# Altium footprint library Selex_PCBLib.PcbLib: 388 footprints (part 12 of 25)
Each footprint in its own frame and in the unit in brackets; x right, y up, seen from the top. Pads: shape width x height; smd on the part's side, far side on the other; paste and mask are expansions set on the pad; w line width, h text height; cw(c..) or ccw(c..) is an arc to the next point about the centre after c.
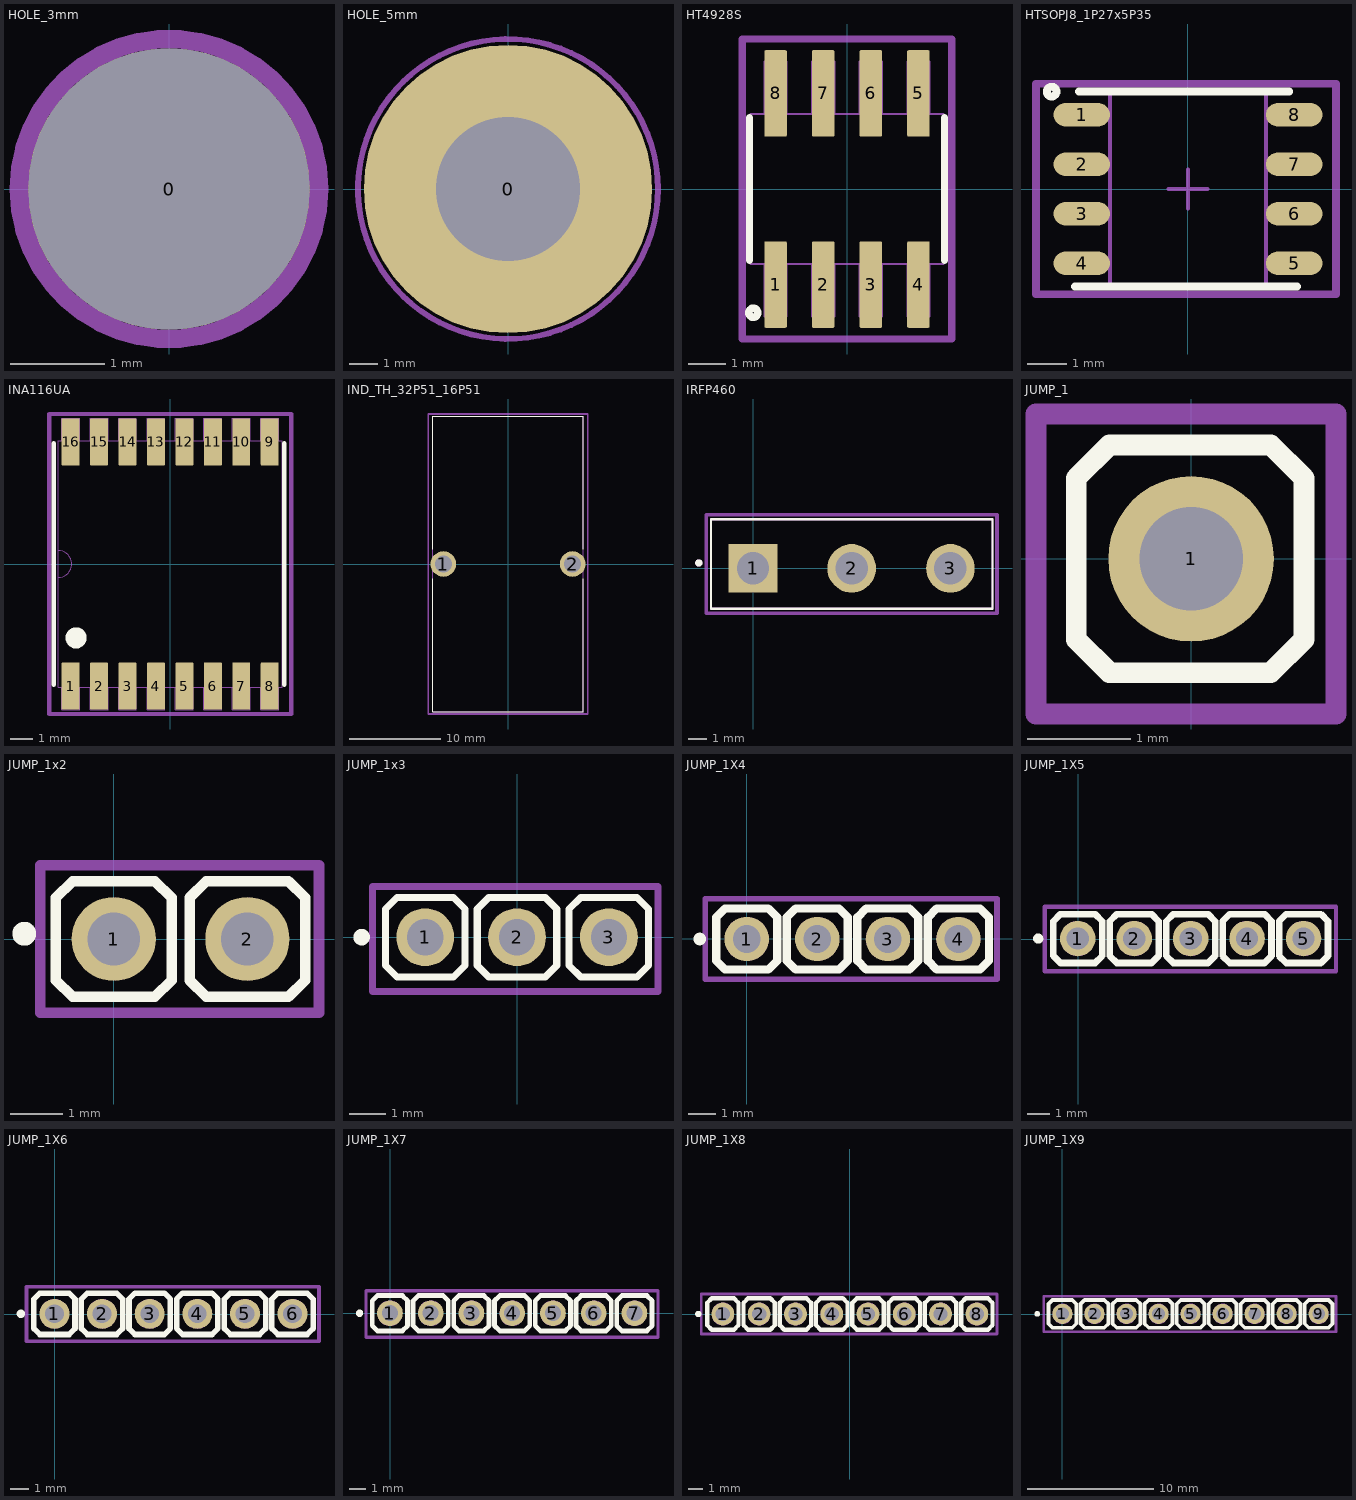
[diagram p11: the footprints below, top view; thin cyan lines are the x and y axes]

## HOLE_3mm [mm]
pads (1):
  round 3 hole 3 mask+0.075: 0(0,0)
Mechanical 15:
  circle w0.2: c0,0 r1.6

## HOLE_5mm [mm]
pads (1):
  round 10 hole 5 mask+0.075: 0(0,0)
Mechanical 15:
  circle w0.2: c0,0 r5.2

## HT4928S [mm] "SOP8, SMD, 1.27MM"
pads (8):
  rrect10% 0.6x2.3 smd mask+0.05: 1(-1.905,-2.55) 2(-0.635,-2.55) 3(0.635,-2.55) 4(1.905,-2.55) 5(1.905,2.55) 6(0.635,2.55) 7(-0.635,2.55) 8(-1.905,2.55)
Top Overlay:
  circle w0.2: c-2.5,-3.3 r0.12
  lines w0.2: -2.6,-1.9 -2.6,1.9 ; 2.6,-1.9 2.6,1.9
Mechanical 1:
  lines w0.05: -2.575,-0.5 -2.575,-2 2.575,-2 2.575,2 -2.575,2 -2.575,0.5 ; -2.205,-3.4 -1.605,-3.4 -1.605,-2 -2.205,-2 -2.205,-3.4 ; -2.205,2 -1.605,2 -1.605,3.4 -2.205,3.4 -2.205,2 ; -0.935,-3.4 -0.935,-2 -0.335,-2 -0.335,-3.4 -0.935,-3.4 ; -0.935,2 -0.335,2 -0.335,3.4 -0.935,3.4 -0.935,2 ; 0.335,-3.4 0.335,-2 0.935,-2 0.935,-3.4 0.335,-3.4 ; 0.335,2 0.935,2 0.935,3.4 0.335,3.4 0.335,2 ; 1.605,-3.4 1.605,-2 2.205,-2 2.205,-3.4 1.605,-3.4 ; 1.605,2 1.605,3.4 2.205,3.4 2.205,2 1.605,2
  text "1" at -2,-1.8 h0.6
  text "4" at 1.7,-1.7 h0.6
  text "5" at 1.7,1.1 h0.6
  text "8" at -2.1,1.1 h0.6
Mechanical 7:
  lines w0.2: -2.8,-4 -2.8,-0.8 -2.8,4 2.8,4 2.8,-4 -2.8,-4
3D body "User Library-HSOP8.STEP": height 1.75, standoff 0, extent -2.5,-3.1 2.5,3.1

## HTSOPJ8_1P27x5P35 [mm] "TSOP, 8-Leads, Body 4.90x3.90mm, Pitch 1.27mm, IPC Medium Density"
height 1
pads (8):
  oval 1.45x0.6 smd: 1(-2.725,1.905) 2(-2.725,0.635) 3(-2.725,-0.635) 4(-2.725,-1.905) 5(2.725,-1.905) 6(2.725,-0.635) 7(2.725,0.635) 8(2.725,1.905)
Top Overlay:
  circle w0.2: c-3.5,2.5 r0.125
  lines w0.2: -2.9,-2.5 2.8,-2.5 ; -2.8,2.5 2.6,2.5
Mechanical 13:
  lines w0.1: -2,-2.5 -2,2.5 2,2.5 2,-2.5 -2,-2.5
Mechanical 15:
  lines w0.1: -0.5,0 0.5,0 ; 0,-0.5 0,0.5
  lines w0.2: -3.9,-2.7 -3.9,2.7 3.8,2.7 3.8,-2.7 -3.9,-2.7
3D body "HTSOP-J8.STEP": height 1.08, standoff 0, extent -3.012,-2.45 3.012,2.45

## INA116UA [mm] "SMD, SOL 16"
pads (16):
  rrect10% 0.8x2.1 smd mask+0.05: 1(-4.445,-5.45) 2(-3.175,-5.45) 3(-1.905,-5.45) 4(-0.635,-5.45) 5(0.635,-5.45) 6(1.905,-5.45) 7(3.175,-5.45) 8(4.445,-5.45) 9(4.445,5.45) 10(3.175,5.45) 11(1.905,5.45) 12(0.635,5.45) 13(-0.635,5.45) 14(-1.905,5.45) 15(-3.175,5.45) 16(-4.445,5.45)
Top Overlay:
  circle w0.5: c-4.2,-3.3 r0.224
  lines w0.2: -5.2,-5.4 -5.2,5.4 ; 5.1,-5.4 5.1,5.4
Mechanical 1:
  lines w0.05: -5,-0.6 ccw(c-5,0) -5,0.6 ; -5,-5.5 -5,5.5 5,5.5 5,-5.5 -5,-5.5 ; -4.845,-6.5 -4.845,-5.5 -4.045,-5.5 -4.045,-6.5 -4.845,-6.5 ; -4.845,5.5 -4.845,6.5 -4.045,6.5 -4.045,5.5 -4.845,5.5 ; -3.575,-6.5 -2.775,-6.5 -2.775,-5.5 -3.575,-5.5 -3.575,-6.5 ; -3.575,5.5 -3.575,6.5 -2.775,6.5 -2.775,5.5 -3.575,5.5 ; -2.305,-6.5 -1.505,-6.5 -1.505,-5.5 -2.305,-5.5 -2.305,-6.5 ; -2.305,5.5 -2.305,6.5 -1.505,6.5 -1.505,5.5 -2.305,5.5 ; -1.035,-6.5 -0.235,-6.5 -0.235,-5.5 -1.035,-5.5 -1.035,-6.5 ; -1.035,5.5 -1.035,6.5 -0.235,6.5 -0.235,5.5 -1.035,5.5 ; 0.235,-6.5 1.035,-6.5 1.035,-5.5 0.235,-5.5 0.235,-6.5 ; 0.235,5.5 0.235,6.5 1.035,6.5 1.035,5.5 0.235,5.5 ; 1.505,-6.5 2.305,-6.5 2.305,-5.5 1.505,-5.5 1.505,-6.5 ; 1.505,5.5 1.505,6.5 2.305,6.5 2.305,5.5 1.505,5.5 ; 2.775,-6.5 3.575,-6.5 3.575,-5.5 2.775,-5.5 2.775,-6.5 ; 2.775,5.5 2.775,6.5 3.575,6.5 3.575,5.5 2.775,5.5 ; 4.045,-6.5 4.845,-6.5 4.845,-5.5 4.045,-5.5 4.045,-6.5 ; 4.045,5.5 4.045,6.5 4.845,6.5 4.845,5.5 4.045,5.5
Mechanical 7:
  lines w0.2: -5.4,-6.7 5.4,-6.7 5.4,6.7 -5.4,6.7 -5.4,-2.2 -5.4,-6.7
3D body "DW16-L.step": height 2.64, standoff 0, extent -5.245,-5.221 5.245,5.421

## IND_TH_32P51_16P51 [mm]
pads (2):
  round 2.82 hole 1.88: 1(-7.112,0) 2(7.112,0)
Top Overlay:
  lines w0.127: -8.255,-1.6 -8.255,-16.256 8.255,-16.256 8.255,-1.6 ; -8.255,1.6 -8.255,16.256 8.255,16.256 8.255,1.6
Mechanical 13:
  lines w0.127: -8.255,-16.256 -8.255,16.256 8.255,16.256 8.255,-16.256 -8.255,-16.256
Mechanical 15:
  lines w0.2: -8.78,-16.506 -8.78,16.506 8.78,16.506 8.78,-16.506 -8.78,-16.506

## IRFP460 [mm]
pads (3):
  rect 2.69x2.69 hole 1.79: 1(0,0)
  round 2.69 hole 1.79: 2(5.46,0) 3(10.92,0)
Top Overlay:
  circle w0.2: c-3,0.3 r0.1
  lines w0.127: -2.33,-2.235 -2.33,2.71 13.25,2.71 13.25,-2.235 -2.33,-2.235
Mechanical 13:
  circle w0.2: c-3,0.3 r0.1
  lines w0.127: -2.33,-2.235 -2.33,2.71 13.25,2.71 13.25,-2.235 -2.33,-2.235
Mechanical 15:
  lines w0.2: -2.58,-2.485 -2.58,2.965 13.5,2.965 13.5,-2.485 -2.58,-2.485
3D body "IRFP460--3DModel-STEP-56544.STEP": height 30.1, standoff -5, extent -2.34,-2.3 13.26,2.7

## JUMP_1 [mm] "JUMP_1_2P54"
pads (1):
  round 1.6 hole 1 mask+0.1: 1(0,0)
Top Overlay:
  lines w0.2: -1.11,-0.78 -0.79,-1.1 0.77,-1.1 1.09,-0.78 1.09,0.78 0.77,1.1 -0.79,1.1 -1.11,0.78 -1.11,-0.78
Mechanical 1:
  circle w0.05: c0,0 r0.762
  lines w0.05: -1.1,-0.78 -0.78,-1.1 0.78,-1.1 1.1,-0.78 1.1,0.78 0.78,1.1 -0.78,1.1 -1.1,0.78 -1.1,-0.78
  text "1" at -0.1,-0.4 h0.8
Mechanical 15:
  lines w0.2: -1.5,-1.5 -1.5,1.4 1.4,1.4 1.4,-1.5 -1.5,-1.5
3D body "HEADER1.step": height 5.94, standoff -2.94, extent -1.3,-1.3 1.24,1.24

## JUMP_1x2 [mm] "JUMP_1x2_2P54"
pads (2):
  round 1.6 hole 1 mask+0.1: 1(0,0) 2(2.54,0)
Top Overlay:
  circle w0.254: c-1.7,0.1 r0.1
  lines w0.2: -1.1,-0.78 -1.1,0.78 -0.78,1.1 0.78,1.1 1.1,0.78 1.1,-0.78 0.78,-1.1 -0.78,-1.1 -1.1,-0.78 ; 1.44,-0.78 1.44,0.78 1.76,1.1 3.32,1.1 3.64,0.78 3.64,-0.78 3.32,-1.1 1.76,-1.1 1.44,-0.78
Mechanical 1:
  circle w0.05: c0,0 r0.762
  circle w0.05: c2.54,0 r0.762
  lines w0.05: -1.1,-0.78 -0.78,-1.1 0.78,-1.1 1.1,-0.78 1.1,0.78 0.78,1.1 -0.78,1.1 -1.1,0.78 -1.1,-0.78 ; 1.44,-0.78 1.44,0.78 1.76,1.1 3.32,1.1 3.64,0.78 3.64,-0.78 3.32,-1.1 1.76,-1.1 1.44,-0.78
  text "1" at -0.1,-0.4 h0.8
  text "2" at 2.3,-0.4 h0.8
Mechanical 15:
  lines w0.2: -1.4,-1.4 -1.4,1.4 3.9,1.4 3.9,-1.4 -1.4,-1.4
3D body "HEADER1.step": height 5.94, standoff -2.94, extent -1.3,-1.3 1.24,1.24
3D body "HEADER1.step": height 5.94, standoff -2.94, extent 1.24,-1.3 3.78,1.24

## JUMP_1x3 [mm] "JUMP_1x3_2P54"
pads (3):
  round 1.6 hole 1 mask+0.1: 1(-2.54,0) 2(0,0) 3(2.54,0)
Top Overlay:
  circle w0.254: c-4.3,0 r0.1
  lines w0.2: -3.64,-0.78 -3.32,-1.1 -1.76,-1.1 -1.44,-0.78 -1.44,0.78 -1.76,1.1 -3.32,1.1 -3.64,0.78 -3.64,-0.78 ; -1.1,-0.78 -0.78,-1.1 0.78,-1.1 1.1,-0.78 1.1,0.78 0.78,1.1 -0.78,1.1 -1.1,0.78 -1.1,-0.78 ; 1.44,-0.78 1.76,-1.1 3.32,-1.1 3.64,-0.78 3.64,0.78 3.32,1.1 1.76,1.1 1.44,0.78 1.44,-0.78
Mechanical 1:
  circle w0.05: c2.54,0 r0.762
  circle w0.05: c0,0 r0.762
  circle w0.05: c-2.54,0 r0.762
  lines w0.05: -3.64,-0.78 -3.64,0.78 -3.32,1.1 -1.76,1.1 -1.44,0.78 -1.44,-0.78 -1.76,-1.1 -3.32,-1.1 -3.64,-0.78 ; -1.1,-0.78 -1.1,0.78 -0.78,1.1 0.78,1.1 1.1,0.78 1.1,-0.78 0.78,-1.1 -0.78,-1.1 -1.1,-0.78 ; 1.44,-0.78 1.44,0.78 1.76,1.1 3.32,1.1 3.64,0.78 3.64,-0.78 3.32,-1.1 1.76,-1.1 1.44,-0.78
  text "1" at -2.64,-0.4 h0.8
  text "2" at -0.24,-0.4 h0.8
  text "3" at 2.26,-0.4 h0.8
Mechanical 15:
  lines w0.2: -4,-1.5 -4,1.4 3.9,1.4 3.9,-1.5 -4,-1.5
3D body "HEADER1.step": height 5.94, standoff -2.94, extent 1.24,-1.3 3.78,1.24
3D body "HEADER1.step": height 5.94, standoff -2.94, extent -1.3,-1.3 1.24,1.24
3D body "HEADER1.step": height 5.94, standoff -2.94, extent -3.84,-1.3 -1.3,1.24

## JUMP_1X4 [mm] "JUMP_1X4_2P54"
pads (4):
  round 1.6 hole 1 mask+0.1: 1(-0.01,-0.01) 2(2.53,-0.01) 3(5.07,-0.01) 4(7.61,-0.01)
Top Overlay:
  circle w0.254: c-1.7,-0.01 r0.1
  lines w0.3: -1.11,-0.79 -1.11,0.77 -0.79,1.09 0.77,1.09 1.09,0.77 1.09,-0.79 0.77,-1.11 -0.79,-1.11 -1.11,-0.79 ; 1.43,-0.79 1.43,0.77 1.75,1.09 3.31,1.09 3.63,0.77 3.63,-0.79 3.31,-1.11 1.75,-1.11 1.43,-0.79 ; 3.97,-0.79 3.97,0.77 4.29,1.09 5.85,1.09 6.17,0.77 6.17,-0.79 5.85,-1.11 4.29,-1.11 3.97,-0.79 ; 6.51,-0.79 6.51,0.77 6.83,1.09 8.39,1.09 8.71,0.77 8.71,-0.79 8.39,-1.11 6.83,-1.11 6.51,-0.79
Mechanical 1:
  circle w0.05: c-0.01,-0.01 r0.762
  circle w0.05: c2.53,-0.01 r0.762
  circle w0.05: c5.07,-0.01 r0.762
  circle w0.05: c7.61,-0.01 r0.762
  lines w0.05: -1.11,-0.79 -0.79,-1.11 0.77,-1.11 1.09,-0.79 1.09,0.77 0.77,1.09 -0.79,1.09 -1.11,0.77 -1.11,-0.79 ; 1.43,-0.79 1.75,-1.11 3.31,-1.11 3.63,-0.79 3.63,0.77 3.31,1.09 1.75,1.09 1.43,0.77 1.43,-0.79 ; 3.97,-0.79 4.29,-1.11 5.85,-1.11 6.17,-0.79 6.17,0.77 5.85,1.09 4.29,1.09 3.97,0.77 3.97,-0.79 ; 6.51,-0.79 6.83,-1.11 8.39,-1.11 8.71,-0.79 8.71,0.77 8.39,1.09 6.83,1.09 6.51,0.77 6.51,-0.79
  text "1" at -0.18,-0.37 h0.8
  text "2" at 2.22,-0.37 h0.8
  text "3" at 4.82,-0.37 h0.8
  text "4" at 7.32,-0.37 h0.8
Mechanical 15:
  lines w0.2: -1.5,-1.46 -1.5,1.44 9,1.44 9,-1.46 -1.5,-1.46
3D body "HEADER1.step": height 5.94, standoff -2.94, extent 3.77,-1.31 6.31,1.23
3D body "HEADER1.step": height 5.94, standoff -2.94, extent 6.31,-1.31 8.85,1.23
3D body "HEADER1.step": height 5.94, standoff -2.94, extent 1.23,-1.31 3.77,1.23
3D body "HEADER1.step": height 5.94, standoff -2.94, extent -1.31,-1.31 1.23,1.23

## JUMP_1X5 [mm] "JUMP_1X5_2P54"
pads (5):
  round 1.6 hole 1 mask+0.1: 1(-0.02,0.02) 2(2.52,0.02) 3(5.06,0.02) 4(7.6,0.02) 5(10.14,0.02)
Top Overlay:
  circle w0.254: c-1.8,0.02 r0.1
  lines w0.3: -1.12,-0.76 -0.8,-1.08 0.76,-1.08 1.08,-0.76 1.08,0.8 0.76,1.12 -0.8,1.12 -1.12,0.8 -1.12,-0.76 ; 1.42,-0.76 1.74,-1.08 3.3,-1.08 3.62,-0.76 3.62,0.8 3.3,1.12 1.74,1.12 1.42,0.8 1.42,-0.76 ; 3.96,-0.76 4.28,-1.08 5.84,-1.08 6.16,-0.76 6.16,0.8 5.84,1.12 4.28,1.12 3.96,0.8 3.96,-0.76 ; 6.5,-0.76 6.82,-1.08 8.38,-1.08 8.7,-0.76 8.7,0.8 8.38,1.12 6.82,1.12 6.5,0.8 6.5,-0.76 ; 9.04,-0.76 9.36,-1.08 10.92,-1.08 11.24,-0.76 11.24,0.8 10.92,1.12 9.36,1.12 9.04,0.8 9.04,-0.76
Mechanical 1:
  circle w0.05: c10.14,0.02 r0.762
  circle w0.05: c7.6,0.02 r0.762
  circle w0.05: c5.06,0.02 r0.762
  circle w0.05: c2.52,0.02 r0.762
  circle w0.05: c-0.02,0.02 r0.762
  lines w0.05: -1.12,-0.76 -1.12,0.8 -0.8,1.12 0.76,1.12 1.08,0.8 1.08,-0.76 0.76,-1.08 -0.8,-1.08 -1.12,-0.76 ; 1.42,-0.76 1.42,0.8 1.74,1.12 3.3,1.12 3.62,0.8 3.62,-0.76 3.3,-1.08 1.74,-1.08 1.42,-0.76 ; 3.96,-0.76 3.96,0.8 4.28,1.12 5.84,1.12 6.16,0.8 6.16,-0.76 5.84,-1.08 4.28,-1.08 3.96,-0.76 ; 6.5,-0.76 6.5,0.8 6.82,1.12 8.38,1.12 8.7,0.8 8.7,-0.76 8.38,-1.08 6.82,-1.08 6.5,-0.76 ; 9.04,-0.76 9.04,0.8 9.36,1.12 10.92,1.12 11.24,0.8 11.24,-0.76 10.92,-1.08 9.36,-1.08 9.04,-0.76
  text "5" at 9.88,-0.38 h0.8
  text "1" at -0.12,-0.38 h0.8
  text "2" at 2.28,-0.38 h0.8
  text "3" at 4.86,-0.38 h0.8
  text "4" at 7.26,-0.38 h0.8
Mechanical 15:
  lines w0.2: -1.5,-1.45 -1.5,1.45 11.6,1.45 11.6,-1.45 -1.5,-1.45
3D body "HEADER1.step": height 5.94, standoff -2.94, extent 8.84,-1.28 11.38,1.26
3D body "HEADER1.step": height 5.94, standoff -2.94, extent 6.3,-1.28 8.84,1.26
3D body "HEADER1.step": height 5.94, standoff -2.94, extent 3.76,-1.28 6.3,1.26
3D body "HEADER1.step": height 5.94, standoff -2.94, extent 1.22,-1.28 3.76,1.26
3D body "HEADER1.step": height 5.94, standoff -2.94, extent -1.32,-1.28 1.22,1.26

## JUMP_1X6 [mm] "JUMP_1X6_2P54"
pads (6):
  round 1.6 hole 1 mask+0.1: 1(-0.01,0.01) 2(2.53,0.01) 3(5.07,0.01) 4(7.61,0.01) 5(10.15,0.01) 6(12.69,0.01)
Top Overlay:
  circle w0.254: c-1.8,0.01 r0.1
  lines w0.3: -1.11,-0.77 -0.79,-1.09 0.77,-1.09 1.09,-0.77 1.09,0.79 0.77,1.11 -0.79,1.11 -1.11,0.79 -1.11,-0.77 ; 1.43,-0.77 1.75,-1.09 3.31,-1.09 3.63,-0.77 3.63,0.79 3.31,1.11 1.75,1.11 1.43,0.79 1.43,-0.77 ; 3.97,-0.77 4.29,-1.09 5.85,-1.09 6.17,-0.77 6.17,0.79 5.85,1.11 4.29,1.11 3.97,0.79 3.97,-0.77 ; 6.51,-0.77 6.83,-1.09 8.39,-1.09 8.71,-0.77 8.71,0.79 8.39,1.11 6.83,1.11 6.51,0.79 6.51,-0.77 ; 9.05,-0.77 9.37,-1.09 10.93,-1.09 11.25,-0.77 11.25,0.79 10.93,1.11 9.37,1.11 9.05,0.79 9.05,-0.77 ; 11.59,-0.77 11.91,-1.09 13.47,-1.09 13.79,-0.77 13.79,0.79 13.47,1.11 11.91,1.11 11.59,0.79 11.59,-0.77
Mechanical 1:
  circle w0.05: c-0.01,0.01 r0.762
  circle w0.05: c2.53,0.01 r0.762
  circle w0.05: c5.07,0.01 r0.762
  circle w0.05: c7.61,0.01 r0.762
  circle w0.05: c10.15,0.01 r0.762
  circle w0.05: c12.69,0.01 r0.762
  lines w0.05: -1.11,-0.77 -1.11,0.79 -0.79,1.11 0.77,1.11 1.09,0.79 1.09,-0.77 0.77,-1.09 -0.79,-1.09 -1.11,-0.77 ; 1.43,-0.77 1.43,0.79 1.75,1.11 3.31,1.11 3.63,0.79 3.63,-0.77 3.31,-1.09 1.75,-1.09 1.43,-0.77 ; 3.97,-0.77 3.97,0.79 4.29,1.11 5.85,1.11 6.17,0.79 6.17,-0.77 5.85,-1.09 4.29,-1.09 3.97,-0.77 ; 6.51,-0.77 6.51,0.79 6.83,1.11 8.39,1.11 8.71,0.79 8.71,-0.77 8.39,-1.09 6.83,-1.09 6.51,-0.77 ; 9.05,-0.77 9.05,0.79 9.37,1.11 10.93,1.11 11.25,0.79 11.25,-0.77 10.93,-1.09 9.37,-1.09 9.05,-0.77 ; 11.59,-0.77 11.59,0.79 11.91,1.11 13.47,1.11 13.79,0.79 13.79,-0.77 13.47,-1.09 11.91,-1.09 11.59,-0.77
  text "6" at 12.38,-0.41 h0.8
  text "4" at 7.31,-0.36 h0.8
  text "3" at 4.81,-0.36 h0.8
  text "2" at 2.23,-0.36 h0.8
  text "1" at -0.17,-0.36 h0.8
  text "5" at 9.91,-0.36 h0.8
Mechanical 15:
  lines w0.2: -1.5,-1.45 14.1,-1.45 14.1,1.45 -1.5,1.45 -1.5,-1.45
3D body "HEADER1.step": height 5.94, standoff -2.94, extent -1.31,-1.29 1.23,1.25
3D body "HEADER1.step": height 5.94, standoff -2.94, extent 1.23,-1.29 3.77,1.25
3D body "HEADER1.step": height 5.94, standoff -2.94, extent 3.77,-1.29 6.31,1.25
3D body "HEADER1.step": height 5.94, standoff -2.94, extent 6.31,-1.29 8.85,1.25
3D body "HEADER1.step": height 5.94, standoff -2.94, extent 8.85,-1.29 11.39,1.25
3D body "HEADER1.step": height 5.94, standoff -2.94, extent 11.39,-1.29 13.93,1.25

## JUMP_1X7 [mm] "JUMP_1X7_2P54"
pads (7):
  round 1.6 hole 1 mask+0.1: 1(-0.01,0) 2(2.53,0) 3(5.07,0) 4(7.61,0) 5(10.15,0) 6(12.69,0) 7(15.23,0)
Top Overlay:
  circle w0.254: c-1.9,0 r0.1
  lines w0.3: -1.11,-0.78 -1.11,0.78 -0.79,1.1 0.77,1.1 1.09,0.78 1.09,-0.78 0.77,-1.1 -0.79,-1.1 -1.11,-0.78 ; 1.43,-0.78 1.43,0.78 1.75,1.1 3.31,1.1 3.63,0.78 3.63,-0.78 3.31,-1.1 1.75,-1.1 1.43,-0.78 ; 3.97,-0.78 3.97,0.78 4.29,1.1 5.85,1.1 6.17,0.78 6.17,-0.78 5.85,-1.1 4.29,-1.1 3.97,-0.78 ; 6.51,-0.78 6.51,0.78 6.83,1.1 8.39,1.1 8.71,0.78 8.71,-0.78 8.39,-1.1 6.83,-1.1 6.51,-0.78 ; 9.05,-0.78 9.05,0.78 9.37,1.1 10.93,1.1 11.25,0.78 11.25,-0.78 10.93,-1.1 9.37,-1.1 9.05,-0.78 ; 11.59,-0.78 11.59,0.78 11.91,1.1 13.47,1.1 13.79,0.78 13.79,-0.78 13.47,-1.1 11.91,-1.1 11.59,-0.78 ; 14.13,-0.78 14.13,0.78 14.45,1.1 16.01,1.1 16.33,0.78 16.33,-0.78 16.01,-1.1 14.45,-1.1 14.13,-0.78
Mechanical 1:
  circle w0.05: c-0.01,0 r0.762
  circle w0.05: c2.53,0 r0.762
  circle w0.05: c5.07,0 r0.762
  circle w0.05: c7.61,0 r0.762
  circle w0.05: c10.15,0 r0.762
  circle w0.05: c12.69,0 r0.762
  circle w0.05: c15.23,0 r0.762
  lines w0.05: -1.11,-0.78 -0.79,-1.1 0.77,-1.1 1.09,-0.78 1.09,0.78 0.77,1.1 -0.79,1.1 -1.11,0.78 -1.11,-0.78 ; 1.43,-0.78 1.75,-1.1 3.31,-1.1 3.63,-0.78 3.63,0.78 3.31,1.1 1.75,1.1 1.43,0.78 1.43,-0.78 ; 3.97,-0.78 4.29,-1.1 5.85,-1.1 6.17,-0.78 6.17,0.78 5.85,1.1 4.29,1.1 3.97,0.78 3.97,-0.78 ; 6.51,-0.78 6.83,-1.1 8.39,-1.1 8.71,-0.78 8.71,0.78 8.39,1.1 6.83,1.1 6.51,0.78 6.51,-0.78 ; 9.05,-0.78 9.37,-1.1 10.93,-1.1 11.25,-0.78 11.25,0.78 10.93,1.1 9.37,1.1 9.05,0.78 9.05,-0.78 ; 11.59,-0.78 11.91,-1.1 13.47,-1.1 13.79,-0.78 13.79,0.78 13.47,1.1 11.91,1.1 11.59,0.78 11.59,-0.78 ; 14.13,-0.78 14.45,-1.1 16.01,-1.1 16.33,-0.78 16.33,0.78 16.01,1.1 14.45,1.1 14.13,0.78 14.13,-0.78
  text "7" at 15.05,-0.5 h0.8
  text "5" at 9.95,-0.4 h0.8
  text "1" at -0.13,-0.4 h0.8
  text "2" at 2.27,-0.4 h0.8
  text "3" at 4.85,-0.4 h0.8
  text "4" at 7.35,-0.4 h0.8
  text "6" at 12.42,-0.45 h0.8
Mechanical 15:
  lines w0.2: -1.5,-1.5 16.7,-1.5 16.7,1.4 -1.5,1.4 -1.5,-1.5
3D body "HEADER1.step": height 5.94, standoff -2.94, extent -1.31,-1.3 1.23,1.24
3D body "HEADER1.step": height 5.94, standoff -2.94, extent 1.23,-1.3 3.77,1.24
3D body "HEADER1.step": height 5.94, standoff -2.94, extent 3.77,-1.3 6.31,1.24
3D body "HEADER1.step": height 5.94, standoff -2.94, extent 6.31,-1.3 8.85,1.24
3D body "HEADER1.step": height 5.94, standoff -2.94, extent 8.85,-1.3 11.39,1.24
3D body "HEADER1.step": height 5.94, standoff -2.94, extent 11.39,-1.3 13.93,1.24
3D body "HEADER1.step": height 5.94, standoff -2.94, extent 13.93,-1.3 16.47,1.24

## JUMP_1X8 [mm] "JUMP_1X8_2P54"
pads (8):
  round 1.6 hole 1 mask+0.1: 1(-8.89,0) 2(-6.35,0) 3(-3.81,0) 4(-1.27,0) 5(1.27,0) 6(3.81,0) 7(6.35,0) 8(8.89,0)
Top Overlay:
  circle w0.254: c-10.6,0 r0.1
  lines w0.3: -9.99,-0.78 -9.67,-1.1 -8.11,-1.1 -7.79,-0.78 -7.79,0.78 -8.11,1.1 -9.67,1.1 -9.99,0.78 -9.99,-0.78 ; -7.45,-0.78 -7.13,-1.1 -5.57,-1.1 -5.25,-0.78 -5.25,0.78 -5.57,1.1 -7.13,1.1 -7.45,0.78 -7.45,-0.78 ; -4.91,-0.78 -4.59,-1.1 -3.03,-1.1 -2.71,-0.78 -2.71,0.78 -3.03,1.1 -4.59,1.1 -4.91,0.78 -4.91,-0.78 ; -2.37,-0.78 -2.05,-1.1 -0.49,-1.1 -0.17,-0.78 -0.17,0.78 -0.49,1.1 -2.05,1.1 -2.37,0.78 -2.37,-0.78 ; 0.17,-0.78 0.49,-1.1 2.05,-1.1 2.37,-0.78 2.37,0.78 2.05,1.1 0.49,1.1 0.17,0.78 0.17,-0.78 ; 2.71,-0.78 3.03,-1.1 4.59,-1.1 4.91,-0.78 4.91,0.78 4.59,1.1 3.03,1.1 2.71,0.78 2.71,-0.78 ; 5.25,-0.78 5.57,-1.1 7.13,-1.1 7.45,-0.78 7.45,0.78 7.13,1.1 5.57,1.1 5.25,0.78 5.25,-0.78 ; 7.79,-0.78 8.11,-1.1 9.67,-1.1 9.99,-0.78 9.99,0.78 9.67,1.1 8.11,1.1 7.79,0.78 7.79,-0.78
Mechanical 1:
  circle w0.05: c-8.89,0 r0.762
  circle w0.05: c-6.35,0 r0.762
  circle w0.05: c-3.81,0 r0.762
  circle w0.05: c-1.27,0 r0.762
  circle w0.05: c1.27,0 r0.762
  circle w0.05: c3.81,0 r0.762
  circle w0.05: c6.35,0 r0.762
  circle w0.05: c8.89,0 r0.762
  lines w0.05: -9.99,-0.78 -9.99,0.78 -9.67,1.1 -8.11,1.1 -7.79,0.78 -7.79,-0.78 -8.11,-1.1 -9.67,-1.1 -9.99,-0.78 ; -7.45,-0.78 -7.45,0.78 -7.13,1.1 -5.57,1.1 -5.25,0.78 -5.25,-0.78 -5.57,-1.1 -7.13,-1.1 -7.45,-0.78 ; -4.91,-0.78 -4.91,0.78 -4.59,1.1 -3.03,1.1 -2.71,0.78 -2.71,-0.78 -3.03,-1.1 -4.59,-1.1 -4.91,-0.78 ; -2.37,-0.78 -2.37,0.78 -2.05,1.1 -0.49,1.1 -0.17,0.78 -0.17,-0.78 -0.49,-1.1 -2.05,-1.1 -2.37,-0.78 ; 0.17,-0.78 0.17,0.78 0.49,1.1 2.05,1.1 2.37,0.78 2.37,-0.78 2.05,-1.1 0.49,-1.1 0.17,-0.78 ; 2.71,-0.78 2.71,0.78 3.03,1.1 4.59,1.1 4.91,0.78 4.91,-0.78 4.59,-1.1 3.03,-1.1 2.71,-0.78 ; 5.25,-0.78 5.25,0.78 5.57,1.1 7.13,1.1 7.45,0.78 7.45,-0.78 7.13,-1.1 5.57,-1.1 5.25,-0.78 ; 7.79,-0.78 7.79,0.78 8.11,1.1 9.67,1.1 9.99,0.78 9.99,-0.78 9.67,-1.1 8.11,-1.1 7.79,-0.78
  text "8" at 8.57,-0.5 h0.8
  text "7" at 6.17,-0.45 h0.8
  text "5" at 1.07,-0.4 h0.8
  text "1" at -9.01,-0.4 h0.8
  text "2" at -6.61,-0.4 h0.8
  text "3" at -4.03,-0.4 h0.8
  text "4" at -1.53,-0.4 h0.8
  text "6" at 3.54,-0.45 h0.8
Mechanical 15:
  lines w0.2: -10.4,-1.4 10.3,-1.4 10.3,1.4 -10.4,1.4 -10.4,-1.4
3D body "HEADER1.step": height 5.94, standoff -2.94, extent -10.19,-1.3 -7.65,1.24
3D body "HEADER1.step": height 5.94, standoff -2.94, extent -7.65,-1.3 -5.11,1.24
3D body "HEADER1.step": height 5.94, standoff -2.94, extent -5.11,-1.3 -2.57,1.24
3D body "HEADER1.step": height 5.94, standoff -2.94, extent -2.57,-1.3 -0.03,1.24
3D body "HEADER1.step": height 5.94, standoff -2.94, extent -0.03,-1.3 2.51,1.24
3D body "HEADER1.step": height 5.94, standoff -2.94, extent 2.51,-1.3 5.05,1.24
3D body "HEADER1.step": height 5.94, standoff -2.94, extent 5.05,-1.3 7.59,1.24
3D body "HEADER1.step": height 5.94, standoff -2.94, extent 7.59,-1.3 10.13,1.24

## JUMP_1X9 [mm] "JUMP_1X9_2P54"
pads (9):
  round 1.6 hole 1 mask+0.1: 1(0,0.01) 2(2.54,0.01) 3(5.08,0.01) 4(7.62,0.01) 5(10.16,0.01) 6(12.7,0.01) 7(15.24,0.01) 8(17.78,0.01) 9(20.32,0.01)
Top Overlay:
  circle w0.254: c-2,0.01 r0.1
  lines w0.3: -1.1,-0.77 -0.78,-1.09 0.78,-1.09 1.1,-0.77 1.1,0.79 0.78,1.11 -0.78,1.11 -1.1,0.79 -1.1,-0.77 ; 1.44,-0.77 1.76,-1.09 3.32,-1.09 3.64,-0.77 3.64,0.79 3.32,1.11 1.76,1.11 1.44,0.79 1.44,-0.77 ; 3.98,-0.77 4.3,-1.09 5.86,-1.09 6.18,-0.77 6.18,0.79 5.86,1.11 4.3,1.11 3.98,0.79 3.98,-0.77 ; 6.52,-0.77 6.84,-1.09 8.4,-1.09 8.72,-0.77 8.72,0.79 8.4,1.11 6.84,1.11 6.52,0.79 6.52,-0.77 ; 9.06,-0.77 9.38,-1.09 10.94,-1.09 11.26,-0.77 11.26,0.79 10.94,1.11 9.38,1.11 9.06,0.79 9.06,-0.77 ; 11.6,-0.77 11.92,-1.09 13.48,-1.09 13.8,-0.77 13.8,0.79 13.48,1.11 11.92,1.11 11.6,0.79 11.6,-0.77 ; 14.14,-0.77 14.46,-1.09 16.02,-1.09 16.34,-0.77 16.34,0.79 16.02,1.11 14.46,1.11 14.14,0.79 14.14,-0.77 ; 16.68,-0.77 17,-1.09 18.56,-1.09 18.88,-0.77 18.88,0.79 18.56,1.11 17,1.11 16.68,0.79 16.68,-0.77 ; 19.22,-0.77 19.54,-1.09 21.1,-1.09 21.42,-0.77 21.42,0.79 21.1,1.11 19.54,1.11 19.22,0.79 19.22,-0.77
Mechanical 1:
  circle w0.05: c20.32,0.01 r0.762
  circle w0.05: c17.78,0.01 r0.762
  circle w0.05: c15.24,0.01 r0.762
  circle w0.05: c12.7,0.01 r0.762
  circle w0.05: c10.16,0.01 r0.762
  circle w0.05: c7.62,0.01 r0.762
  circle w0.05: c5.08,0.01 r0.762
  circle w0.05: c2.54,0.01 r0.762
  circle w0.05: c0,0.01 r0.762
  lines w0.05: -1.1,-0.77 -1.1,0.79 -0.78,1.11 0.78,1.11 1.1,0.79 1.1,-0.77 0.78,-1.09 -0.78,-1.09 -1.1,-0.77 ; 1.44,-0.77 1.44,0.79 1.76,1.11 3.32,1.11 3.64,0.79 3.64,-0.77 3.32,-1.09 1.76,-1.09 1.44,-0.77 ; 3.98,-0.77 3.98,0.79 4.3,1.11 5.86,1.11 6.18,0.79 6.18,-0.77 5.86,-1.09 4.3,-1.09 3.98,-0.77 ; 6.52,-0.77 6.52,0.79 6.84,1.11 8.4,1.11 8.72,0.79 8.72,-0.77 8.4,-1.09 6.84,-1.09 6.52,-0.77 ; 9.06,-0.77 9.06,0.79 9.38,1.11 10.94,1.11 11.26,0.79 11.26,-0.77 10.94,-1.09 9.38,-1.09 9.06,-0.77 ; 11.6,-0.77 11.6,0.79 11.92,1.11 13.48,1.11 13.8,0.79 13.8,-0.77 13.48,-1.09 11.92,-1.09 11.6,-0.77 ; 14.14,-0.77 14.14,0.79 14.46,1.11 16.02,1.11 16.34,0.79 16.34,-0.77 16.02,-1.09 14.46,-1.09 14.14,-0.77 ; 16.68,-0.77 16.68,0.79 17,1.11 18.56,1.11 18.88,0.79 18.88,-0.77 18.56,-1.09 17,-1.09 16.68,-0.77 ; 19.22,-0.77 19.22,0.79 19.54,1.11 21.1,1.11 21.42,0.79 21.42,-0.77 21.1,-1.09 19.54,-1.09 19.22,-0.77
  text "9" at 20.06,-0.39 h0.8
  text "8" at 17.46,-1.49 h0.8
  text "6" at 12.43,-0.44 h0.8
  text "4" at 7.36,-0.39 h0.8
  text "3" at 4.86,-0.39 h0.8
  text "2" at 2.28,-0.39 h0.8
  text "1" at -0.12,-0.39 h0.8
  text "5" at 9.96,-0.39 h0.8
  text "7" at 15.06,-0.49 h0.8
Mechanical 15:
  lines w0.2: -1.5,-1.4 21.7,-1.4 21.7,1.4 -1.5,1.4 -1.5,-1.4
3D body "HEADER1.step": height 5.94, standoff -2.94, extent 19.02,-1.29 21.56,1.25
3D body "HEADER1.step": height 5.94, standoff -2.94, extent 16.48,-1.29 19.02,1.25
3D body "HEADER1.step": height 5.94, standoff -2.94, extent 13.94,-1.29 16.48,1.25
3D body "HEADER1.step": height 5.94, standoff -2.94, extent 11.4,-1.29 13.94,1.25
3D body "HEADER1.step": height 5.94, standoff -2.94, extent 8.86,-1.29 11.4,1.25
3D body "HEADER1.step": height 5.94, standoff -2.94, extent 6.32,-1.29 8.86,1.25
3D body "HEADER1.step": height 5.94, standoff -2.94, extent 3.78,-1.29 6.32,1.25
3D body "HEADER1.step": height 5.94, standoff -2.94, extent 1.24,-1.29 3.78,1.25
3D body "HEADER1.step": height 5.94, standoff -2.94, extent -1.3,-1.29 1.24,1.25